# Altium schematic symbol library jlcpcb_2025_04_capacitors_extended_1210.schlib: 709 symbols (part 1 of 4) (continued)
## 1210B222K202CT
designator C?  Capacitance: 2.2nF  (hidden comment: *)
Capacitor, Ceramic (MLCC), 2.2nF, ±10%, 2kV, X7R, ±10%, SMD 1210; Manufacturer: Walsin Tech Corp; Manufacturer Part Number: 1210B222K202CT; Package Size: 1210; JLCPCB Basic Part: No; JLCPCB Part Number: C384714; Supplier 1: LCSC; Category: Capacitors - MLCC; Supplier Part Number 1: C384714; Tolerance: ±10%; Voltage Rating: 2kV; Temperature Coefficient: X7R; RoHS: Yes; ComponentLink1Description: Datasheet; ComponentLink1URL: https://wmsc.lcsc.com/wmsc/upload/file/pdf/v2/lcsc/2304140030_Walsin-Tech-Corp-1210B222K202CT_C384714.pdf; ComponentLink2Description: JLCPCB Part URL; ComponentLink2URL: https://jlcpcb.com/partdetail/C384714; ComponentLink3Description: LCSC Part URL; ComponentLink3URL: https://lcsc.com/product-detail/Multilayer-Ceramic-Capacitors-MLCC---SMD-SMT_Walsin-Tech-Corp-Walsin-Tech-Corp-1210B222K202CT_C384714.html
footprint CAP-1210 (1210 (3225M) Capacitor)
pins: 1, 2

## 1210B222K202NT
designator C?  Capacitance: 2.2nF  (hidden comment: *)
Capacitor, Ceramic (MLCC), 2.2nF, ±10%, 2kV, ±10%, SMD 1210; Manufacturer: FH(Guangdong Fenghua Advanced Tech); Manufacturer Part Number: 1210B222K202NT; Package Size: 1210; JLCPCB Basic Part: No; JLCPCB Part Number: C304014; Supplier 1: LCSC; Category: Capacitors - MLCC; Supplier Part Number 1: C304014; Tolerance: ±10%; Voltage Rating: 2kV; RoHS: Yes; ComponentLink1Description: Datasheet; ComponentLink1URL: https://wmsc.lcsc.com/wmsc/upload/file/pdf/v2/lcsc/2304140030_FH--Guangdong-Fenghua-Advanced-Tech-1210B222K202NT_C304014.pdf; ComponentLink2Description: JLCPCB Part URL; ComponentLink2URL: https://jlcpcb.com/partdetail/C304014; ComponentLink3Description: LCSC Part URL; ComponentLink3URL: https://lcsc.com/product-detail/Multilayer-Ceramic-Capacitors-MLCC---SMD-SMT_FH-Guangdong-Fenghua-Advanced-Tech-FH-Guangdong-Fenghua-Advanced-Tech-1210B222K202NT_C304014.html
footprint CAP-1210 (1210 (3225M) Capacitor)
pins: 1, 2

## 1210B223K102CT
designator C?  Capacitance: 22nF  (hidden comment: *)
Capacitor, Ceramic (MLCC), 22nF, ±10%, 1kV, X7R, ±10%, SMD 1210; Manufacturer: Walsin Tech Corp; Manufacturer Part Number: 1210B223K102CT; Package Size: 1210; JLCPCB Basic Part: No; JLCPCB Part Number: C304015; Supplier 1: LCSC; Category: Capacitors - MLCC; Supplier Part Number 1: C304015; Tolerance: ±10%; Voltage Rating: 1kV; Temperature Coefficient: X7R; RoHS: Yes; ComponentLink1Description: Datasheet; ComponentLink1URL: https://wmsc.lcsc.com/wmsc/upload/file/pdf/v2/lcsc/2304231850_Walsin-Tech-Corp-1210B223K102CT_C304015.pdf; ComponentLink2Description: JLCPCB Part URL; ComponentLink2URL: https://jlcpcb.com/partdetail/C304015; ComponentLink3Description: LCSC Part URL; ComponentLink3URL: https://lcsc.com/product-detail/Multilayer-Ceramic-Capacitors-MLCC---SMD-SMT_Walsin-Tech-Corp-Walsin-Tech-Corp-1210B223K102CT_C304015.html
footprint CAP-1210 (1210 (3225M) Capacitor)
pins: 1, 2

## 1210B223K102NT
designator C?  Capacitance: 22nF  (hidden comment: *)
Capacitor, Ceramic (MLCC), 22nF, ±10%, 1kV, X7R, ±10%, SMD 1210; Manufacturer: FH (Guangdong Fenghua Advanced Tech); Manufacturer Part Number: 1210B223K102NT; Package Size: 1210; JLCPCB Basic Part: No; JLCPCB Part Number: C3037670; Supplier 1: LCSC; Category: Capacitors - MLCC; Supplier Part Number 1: C3037670; Tolerance: ±10%; Voltage Rating: 1kV; Temperature Coefficient: X7R; RoHS: Yes; ComponentLink1Description: Datasheet; ComponentLink1URL: https://wmsc.lcsc.com/wmsc/upload/file/pdf/v2/lcsc/2206171645_FH--Guangdong-Fenghua-Advanced-Tech-1210B223K102NT_C3037670.pdf; ComponentLink2Description: JLCPCB Part URL; ComponentLink2URL: https://jlcpcb.com/partdetail/C3037670; ComponentLink3Description: LCSC Part URL; ComponentLink3URL: https://lcsc.com/product-detail/Multilayer-Ceramic-Capacitors-MLCC---SMD-SMT_FH-Guangdong-Fenghua-Advanced-Tech-FH-Guangdong-Fenghua-Advanced-Tech-1210B223K102NT_C3037670.html
footprint CAP-1210 (1210 (3225M) Capacitor)
pins: 1, 2

## 1210B223K500NT
designator C?  Capacitance: 22nF  (hidden comment: *)
Capacitor, Ceramic (MLCC), 22nF, ±10%, 50V, X7R, ±10%, SMD 1210; Manufacturer: FH (Guangdong Fenghua Advanced Tech); Manufacturer Part Number: 1210B223K500NT; Package Size: 1210; JLCPCB Basic Part: No; JLCPCB Part Number: C3037671; Supplier 1: LCSC; Category: Capacitors - MLCC; Supplier Part Number 1: C3037671; Tolerance: ±10%; Voltage Rating: 50V; Temperature Coefficient: X7R; RoHS: Yes; ComponentLink1Description: Datasheet; ComponentLink1URL: https://wmsc.lcsc.com/wmsc/upload/file/pdf/v2/lcsc/2206171645_FH--Guangdong-Fenghua-Advanced-Tech-1210B223K500NT_C3037671.pdf; ComponentLink2Description: JLCPCB Part URL; ComponentLink2URL: https://jlcpcb.com/partdetail/C3037671; ComponentLink3Description: LCSC Part URL; ComponentLink3URL: https://lcsc.com/product-detail/Multilayer-Ceramic-Capacitors-MLCC---SMD-SMT_FH-Guangdong-Fenghua-Advanced-Tech-FH-Guangdong-Fenghua-Advanced-Tech-1210B223K500NT_C3037671.html
footprint CAP-1210 (1210 (3225M) Capacitor)
pins: 1, 2

## 1210B223K501CT
designator C?  Capacitance: 22nF  (hidden comment: *)
Capacitor, Ceramic (MLCC), 22nF, ±10%, 500V, X7R, ±10%, SMD 1210; Manufacturer: Walsin Tech Corp; Manufacturer Part Number: 1210B223K501CT; Package Size: 1210; JLCPCB Basic Part: No; JLCPCB Part Number: C77533; Supplier 1: LCSC; Category: Capacitors - MLCC; Supplier Part Number 1: C77533; Tolerance: ±10%; Voltage Rating: 500V; Temperature Coefficient: X7R; RoHS: Yes; ComponentLink1Description: Datasheet; ComponentLink1URL: https://wmsc.lcsc.com/wmsc/upload/file/pdf/v2/lcsc/1809301128_Walsin-Tech-Corp-1210B223K501CT_C77533.pdf; ComponentLink2Description: JLCPCB Part URL; ComponentLink2URL: https://jlcpcb.com/partdetail/C77533; ComponentLink3Description: LCSC Part URL; ComponentLink3URL: https://lcsc.com/product-detail/Multilayer-Ceramic-Capacitors-MLCC---SMD-SMT_Walsin-Tech-Corp-Walsin-Tech-Corp-1210B223K501CT_C77533.html
footprint CAP-1210 (1210 (3225M) Capacitor)
pins: 1, 2

## 1210B223K631CT
designator C?  Capacitance: 22nF  (hidden comment: *)
Capacitor, Ceramic (MLCC), 22nF, ±10%, 630V, X7R, ±10%, SMD 1210; Manufacturer: Walsin Tech Corp; Manufacturer Part Number: 1210B223K631CT; Package Size: 1210; JLCPCB Basic Part: No; JLCPCB Part Number: C515685; Supplier 1: LCSC; Category: Capacitors - MLCC; Supplier Part Number 1: C515685; Tolerance: ±10%; Voltage Rating: 630V; Temperature Coefficient: X7R; RoHS: Yes; ComponentLink1Description: Datasheet; ComponentLink1URL: https://wmsc.lcsc.com/wmsc/upload/file/pdf/v2/lcsc/2304140030_Walsin-Tech-Corp-1210B223K631CT_C515685.pdf; ComponentLink2Description: JLCPCB Part URL; ComponentLink2URL: https://jlcpcb.com/partdetail/C515685; ComponentLink3Description: LCSC Part URL; ComponentLink3URL: https://lcsc.com/product-detail/Multilayer-Ceramic-Capacitors-MLCC---SMD-SMT_Walsin-Tech-Corp-Walsin-Tech-Corp-1210B223K631CT_C515685.html
footprint CAP-1210 (1210 (3225M) Capacitor)
pins: 1, 2

## 1210B224K101CT
designator C?  Capacitance: 220nF  (hidden comment: *)
Capacitor, Ceramic (MLCC), 220nF, ±10%, 100V, X7R, ±10%, SMD 1210; Manufacturer: Walsin Tech Corp; Manufacturer Part Number: 1210B224K101CT; Package Size: 1210; JLCPCB Basic Part: No; JLCPCB Part Number: C396814; Supplier 1: LCSC; Category: Capacitors - MLCC; Supplier Part Number 1: C396814; Tolerance: ±10%; Voltage Rating: 100V; Temperature Coefficient: X7R; RoHS: Yes; ComponentLink1Description: Datasheet; ComponentLink1URL: https://wmsc.lcsc.com/wmsc/upload/file/pdf/v2/lcsc/2304140030_Walsin-Tech-Corp-1210B224K101CT_C396814.pdf; ComponentLink2Description: JLCPCB Part URL; ComponentLink2URL: https://jlcpcb.com/partdetail/C396814; ComponentLink3Description: LCSC Part URL; ComponentLink3URL: https://lcsc.com/product-detail/Multilayer-Ceramic-Capacitors-MLCC---SMD-SMT_Walsin-Tech-Corp-Walsin-Tech-Corp-1210B224K101CT_C396814.html
footprint CAP-1210 (1210 (3225M) Capacitor)
pins: 1, 2

## 1210B224K101NT
designator C?  Capacitance: 220nF  (hidden comment: *)
Capacitor, Ceramic (MLCC), 220nF, ±10%, 100V, X7R, ±10%, SMD 1210; Manufacturer: FH(Guangdong Fenghua Advanced Tech); Manufacturer Part Number: 1210B224K101NT; Package Size: 1210; JLCPCB Basic Part: No; JLCPCB Part Number: C72067; Supplier 1: LCSC; Category: Capacitors - MLCC; Supplier Part Number 1: C72067; Tolerance: ±10%; Voltage Rating: 100V; Temperature Coefficient: X7R; RoHS: Yes; ComponentLink1Description: Datasheet; ComponentLink1URL: https://wmsc.lcsc.com/wmsc/upload/file/pdf/v2/lcsc/2304140030_FH--Guangdong-Fenghua-Advanced-Tech-1210B224K101NT_C72067.pdf; ComponentLink2Description: JLCPCB Part URL; ComponentLink2URL: https://jlcpcb.com/partdetail/C72067; ComponentLink3Description: LCSC Part URL; ComponentLink3URL: https://lcsc.com/product-detail/Multilayer-Ceramic-Capacitors-MLCC---SMD-SMT_FH-Guangdong-Fenghua-Advanced-Tech-FH-Guangdong-Fenghua-Advanced-Tech-1210B224K101NT_C72067.html
footprint CAP-1210 (1210 (3225M) Capacitor)
pins: 1, 2

## 1210B224K251NT
designator C?  Capacitance: 220000pF  (hidden comment: *)
Capacitor, Ceramic (MLCC), 220000pF, ±10%, 250V, X7R, ±10%, SMD 1210; Manufacturer: FH (Guangdong Fenghua Advanced Tech); Manufacturer Part Number: 1210B224K251NT; Package Size: 1210; JLCPCB Basic Part: No; JLCPCB Part Number: C967601; Supplier 1: LCSC; Category: Capacitors - MLCC; Supplier Part Number 1: C967601; Tolerance: ±10%; Voltage Rating: 250V; Temperature Coefficient: X7R; RoHS: Yes; ComponentLink1Description: Datasheet; ComponentLink1URL: https://wmsc.lcsc.com/wmsc/upload/file/pdf/v2/lcsc/2304140030_FH--Guangdong-Fenghua-Advanced-Tech-1210B224K251NT_C967601.pdf; ComponentLink2Description: JLCPCB Part URL; ComponentLink2URL: https://jlcpcb.com/partdetail/C967601; ComponentLink3Description: LCSC Part URL; ComponentLink3URL: https://lcsc.com/product-detail/Multilayer-Ceramic-Capacitors-MLCC---SMD-SMT_FH-Guangdong-Fenghua-Advanced-Tech-FH-Guangdong-Fenghua-Advanced-Tech-1210B224K251NT_C967601.html
footprint CAP-1210 (1210 (3225M) Capacitor)
pins: 1, 2

## 1210B224K500NT
designator C?  Capacitance: 220nF  (hidden comment: *)
Capacitor, Ceramic (MLCC), 220nF, ±10%, 50V, ±10%, SMD 1210; Manufacturer: FH(Guangdong Fenghua Advanced Tech); Manufacturer Part Number: 1210B224K500NT; Package Size: 1210; JLCPCB Basic Part: No; JLCPCB Part Number: C1322393; Supplier 1: LCSC; Category: Capacitors - MLCC; Supplier Part Number 1: C1322393; Tolerance: ±10%; Voltage Rating: 50V; RoHS: Yes; ComponentLink1Description: Datasheet; ComponentLink1URL: https://wmsc.lcsc.com/wmsc/upload/file/pdf/v2/lcsc/2304140030_FH--Guangdong-Fenghua-Advanced-Tech-1210B224K500NT_C1322393.pdf; ComponentLink2Description: JLCPCB Part URL; ComponentLink2URL: https://jlcpcb.com/partdetail/C1322393; ComponentLink3Description: LCSC Part URL; ComponentLink3URL: https://lcsc.com/product-detail/Multilayer-Ceramic-Capacitors-MLCC---SMD-SMT_FH-Guangdong-Fenghua-Advanced-Tech-FH-Guangdong-Fenghua-Advanced-Tech-1210B224K500NT_C1322393.html
footprint CAP-1210 (1210 (3225M) Capacitor)
pins: 1, 2

## 1210B225K101CT
designator C?  Capacitance: 2.2uF  (hidden comment: *)
Capacitor, Ceramic (MLCC), 2.2uF, ±10%, 100V, X7R, ±10%, SMD 1210; Manufacturer: Walsin Tech Corp; Manufacturer Part Number: 1210B225K101CT; Package Size: 1210; JLCPCB Basic Part: No; JLCPCB Part Number: C338133; Supplier 1: LCSC; Category: Capacitors - MLCC; Supplier Part Number 1: C338133; Tolerance: ±10%; Voltage Rating: 100V; Temperature Coefficient: X7R; RoHS: Yes; ComponentLink1Description: Datasheet; ComponentLink1URL: https://wmsc.lcsc.com/wmsc/upload/file/pdf/v2/lcsc/2304140030_Walsin-Tech-Corp-1210B225K101CT_C338133.pdf; ComponentLink2Description: JLCPCB Part URL; ComponentLink2URL: https://jlcpcb.com/partdetail/C338133; ComponentLink3Description: LCSC Part URL; ComponentLink3URL: https://lcsc.com/product-detail/Multilayer-Ceramic-Capacitors-MLCC---SMD-SMT_Walsin-Tech-Corp-Walsin-Tech-Corp-1210B225K101CT_C338133.html
footprint CAP-1210 (1210 (3225M) Capacitor)
pins: 1, 2

## 1210B225K101NT
designator C?  Capacitance: 2.2uF  (hidden comment: *)
Capacitor, Ceramic (MLCC), 2.2uF, ±10%, 100V, X7R, ±10%, SMD 1210; Manufacturer: FH(Guangdong Fenghua Advanced Tech); Manufacturer Part Number: 1210B225K101NT; Package Size: 1210; JLCPCB Basic Part: No; JLCPCB Part Number: C962231; Supplier 1: LCSC; Category: Capacitors - MLCC; Supplier Part Number 1: C962231; Tolerance: ±10%; Voltage Rating: 100V; Temperature Coefficient: X7R; RoHS: Yes; ComponentLink1Description: Datasheet; ComponentLink1URL: https://wmsc.lcsc.com/wmsc/upload/file/pdf/v2/lcsc/2304140030_FH--Guangdong-Fenghua-Advanced-Tech-1210B225K101NT_C962231.pdf; ComponentLink2Description: JLCPCB Part URL; ComponentLink2URL: https://jlcpcb.com/partdetail/C962231; ComponentLink3Description: LCSC Part URL; ComponentLink3URL: https://lcsc.com/product-detail/Multilayer-Ceramic-Capacitors-MLCC---SMD-SMT_FH-Guangdong-Fenghua-Advanced-Tech-FH-Guangdong-Fenghua-Advanced-Tech-1210B225K101NT_C962231.html
footprint CAP-1210 (1210 (3225M) Capacitor)
pins: 1, 2

## 1210B225K500CT
designator C?  Capacitance: 2.2uF  (hidden comment: *)
Capacitor, Ceramic (MLCC), 2.2uF, ±10%, 50V, X7R, ±10%, SMD 1210; Manufacturer: Walsin Tech Corp; Manufacturer Part Number: 1210B225K500CT; Package Size: 1210; JLCPCB Basic Part: No; JLCPCB Part Number: C3852432; Supplier 1: LCSC; Category: Capacitors - MLCC; Supplier Part Number 1: C3852432; Tolerance: ±10%; Voltage Rating: 50V; Temperature Coefficient: X7R; RoHS: Yes; ComponentLink1Description: Datasheet; ComponentLink1URL: https://wmsc.lcsc.com/wmsc/upload/file/pdf/v2/lcsc/2401181613_Walsin-Tech-Corp-1210B225K500CT_C3852432.pdf; ComponentLink2Description: JLCPCB Part URL; ComponentLink2URL: https://jlcpcb.com/partdetail/C3852432; ComponentLink3Description: LCSC Part URL; ComponentLink3URL: https://lcsc.com/product-detail/Multilayer-Ceramic-Capacitors-MLCC---SMD-SMT_Walsin-Tech-Corp-Walsin-Tech-Corp-1210B225K500CT_C3852432.html
footprint CAP-1210 (1210 (3225M) Capacitor)
pins: 1, 2

## 1210B225K500NT
designator C?  Capacitance: 2.2uF  (hidden comment: *)
Capacitor, Ceramic (MLCC), 2.2uF, ±10%, 50V, X7R, ±10%, SMD 1210; Manufacturer: FH(Guangdong Fenghua Advanced Tech); Manufacturer Part Number: 1210B225K500NT; Package Size: 1210; JLCPCB Basic Part: No; JLCPCB Part Number: C1950; Supplier 1: LCSC; Category: Capacitors - MLCC; Supplier Part Number 1: C1950; Tolerance: ±10%; Voltage Rating: 50V; Temperature Coefficient: X7R; RoHS: Yes; ComponentLink1Description: Datasheet; ComponentLink1URL: https://wmsc.lcsc.com/wmsc/upload/file/pdf/v2/lcsc/2304140030_FH--Guangdong-Fenghua-Advanced-Tech-1210B225K500NT_C1950.pdf; ComponentLink2Description: JLCPCB Part URL; ComponentLink2URL: https://jlcpcb.com/partdetail/C1950; ComponentLink3Description: LCSC Part URL; ComponentLink3URL: https://lcsc.com/product-detail/Multilayer-Ceramic-Capacitors-MLCC---SMD-SMT_FH-Guangdong-Fenghua-Advanced-Tech-FH-Guangdong-Fenghua-Advanced-Tech-1210B225K500NT_C1950.html
footprint CAP-1210 (1210 (3225M) Capacitor)
pins: 1, 2

## 1210B226K250CT
designator C?  Capacitance: 22uF  (hidden comment: *)
Capacitor, Ceramic (MLCC), 22uF, ±10%, 25V, X7R, ±10%, SMD 1210; Manufacturer: Walsin Tech Corp; Manufacturer Part Number: 1210B226K250CT; Package Size: 1210; JLCPCB Basic Part: No; JLCPCB Part Number: C515687; Supplier 1: LCSC; Category: Capacitors - MLCC; Supplier Part Number 1: C515687; Tolerance: ±10%; Voltage Rating: 25V; Temperature Coefficient: X7R; RoHS: Yes; ComponentLink1Description: Datasheet; ComponentLink1URL: https://wmsc.lcsc.com/wmsc/upload/file/pdf/v2/lcsc/2304140030_Walsin-Tech-Corp-1210B226K250CT_C515687.pdf; ComponentLink2Description: JLCPCB Part URL; ComponentLink2URL: https://jlcpcb.com/partdetail/C515687; ComponentLink3Description: LCSC Part URL; ComponentLink3URL: https://lcsc.com/product-detail/Multilayer-Ceramic-Capacitors-MLCC---SMD-SMT_Walsin-Tech-Corp-Walsin-Tech-Corp-1210B226K250CT_C515687.html
footprint CAP-1210 (1210 (3225M) Capacitor)
pins: 1, 2

## 1210B226K250NT
designator C?  Capacitance: 22uF  (hidden comment: *)
Capacitor, Ceramic (MLCC), 22uF, 25V, SMD 1210; Manufacturer: FH (Guangdong Fenghua Advanced Tech); Manufacturer Part Number: 1210B226K250NT; Package Size: 1210; JLCPCB Basic Part: No; JLCPCB Part Number: C5204920; Supplier 1: LCSC; Category: Capacitors - MLCC; Supplier Part Number 1: C5204920; Voltage Rating: 25V; RoHS: Yes; ComponentLink1Description: Datasheet; ComponentLink2Description: JLCPCB Part URL; ComponentLink2URL: https://jlcpcb.com/partdetail/C5204920; ComponentLink3Description: LCSC Part URL; ComponentLink3URL: https://lcsc.com/product-detail/Multilayer-Ceramic-Capacitors-MLCC---SMD-SMT_FH-Guangdong-Fenghua-Advanced-Tech-FH-Guangdong-Fenghua-Advanced-Tech-1210B226K250NT_C5204920.html
footprint CAP-1210 (1210 (3225M) Capacitor)
pins: 1, 2

## 1210B226M160
designator C?  Capacitance: 22uF  (hidden comment: *)
Capacitor, Ceramic (MLCC), 22uF, ±20%, 16V, X7R, ±20%, SMD 1210; Manufacturer: Walsin Tech Corp; Manufacturer Part Number: 1210B226M160; Package Size: 1210; JLCPCB Basic Part: No; JLCPCB Part Number: C123667; Supplier 1: LCSC; Category: Capacitors - MLCC; Supplier Part Number 1: C123667; Tolerance: ±20%; Voltage Rating: 16V; Temperature Coefficient: X7R; RoHS: Yes; ComponentLink1Description: Datasheet; ComponentLink1URL: https://wmsc.lcsc.com/wmsc/upload/file/pdf/v2/lcsc/2304140030_Walsin-Tech-Corp-1210B226M160_C123667.pdf; ComponentLink2Description: JLCPCB Part URL; ComponentLink2URL: https://jlcpcb.com/partdetail/C123667; ComponentLink3Description: LCSC Part URL; ComponentLink3URL: https://lcsc.com/product-detail/Multilayer-Ceramic-Capacitors-MLCC---SMD-SMT_Walsin-Tech-Corp-Walsin-Tech-Corp-1210B226M160_C123667.html
footprint CAP-1210 (1210 (3225M) Capacitor)
pins: 1, 2

## 1210B272K202CT
designator C?  Capacitance: 2.7nF  (hidden comment: *)
Capacitor, Ceramic (MLCC), 2.7nF, ±10%, 2kV, X7R, ±10%, SMD 1210; Manufacturer: Walsin Tech Corp; Manufacturer Part Number: 1210B272K202CT; Package Size: 1210; JLCPCB Basic Part: No; JLCPCB Part Number: C384712; Supplier 1: LCSC; Category: Capacitors - MLCC; Supplier Part Number 1: C384712; Tolerance: ±10%; Voltage Rating: 2kV; Temperature Coefficient: X7R; RoHS: Yes; ComponentLink1Description: Datasheet; ComponentLink1URL: https://wmsc.lcsc.com/wmsc/upload/file/pdf/v2/lcsc/2304140030_Walsin-Tech-Corp-1210B272K202CT_C384712.pdf; ComponentLink2Description: JLCPCB Part URL; ComponentLink2URL: https://jlcpcb.com/partdetail/C384712; ComponentLink3Description: LCSC Part URL; ComponentLink3URL: https://lcsc.com/product-detail/Multilayer-Ceramic-Capacitors-MLCC---SMD-SMT_Walsin-Tech-Corp-Walsin-Tech-Corp-1210B272K202CT_C384712.html
footprint CAP-1210 (1210 (3225M) Capacitor)
pins: 1, 2

## 1210B332K102CT
designator C?  Capacitance: 3.3nF  (hidden comment: *)
Capacitor, Ceramic (MLCC), 3.3nF, ±10%, 1kV, X7R, ±10%, SMD 1210; Manufacturer: Walsin Tech Corp; Manufacturer Part Number: 1210B332K102CT; Package Size: 1210; JLCPCB Basic Part: No; JLCPCB Part Number: C304016; Supplier 1: LCSC; Category: Capacitors - MLCC; Supplier Part Number 1: C304016; Tolerance: ±10%; Voltage Rating: 1kV; Temperature Coefficient: X7R; RoHS: Yes; ComponentLink1Description: Datasheet; ComponentLink1URL: https://wmsc.lcsc.com/wmsc/upload/file/pdf/v2/lcsc/2304231850_Walsin-Tech-Corp-1210B332K102CT_C304016.pdf; ComponentLink2Description: JLCPCB Part URL; ComponentLink2URL: https://jlcpcb.com/partdetail/C304016; ComponentLink3Description: LCSC Part URL; ComponentLink3URL: https://lcsc.com/product-detail/Multilayer-Ceramic-Capacitors-MLCC---SMD-SMT_Walsin-Tech-Corp-Walsin-Tech-Corp-1210B332K102CT_C304016.html
footprint CAP-1210 (1210 (3225M) Capacitor)
pins: 1, 2

## 1210B332K202CT
designator C?  Capacitance: 3.3nF  (hidden comment: *)
Capacitor, Ceramic (MLCC), 3.3nF, ±10%, 2kV, X7R, ±10%, SMD 1210; Manufacturer: Walsin Tech Corp; Manufacturer Part Number: 1210B332K202CT; Package Size: 1210; JLCPCB Basic Part: No; JLCPCB Part Number: C2918605; Supplier 1: LCSC; Category: Capacitors - MLCC; Supplier Part Number 1: C2918605; Tolerance: ±10%; Voltage Rating: 2kV; Temperature Coefficient: X7R; RoHS: Yes; ComponentLink1Description: Datasheet; ComponentLink1URL: https://wmsc.lcsc.com/wmsc/upload/file/pdf/v2/lcsc/2111171830_Walsin-Tech-Corp-1210B332K202CT_C2918605.pdf; ComponentLink2Description: JLCPCB Part URL; ComponentLink2URL: https://jlcpcb.com/partdetail/C2918605; ComponentLink3Description: LCSC Part URL; ComponentLink3URL: https://lcsc.com/product-detail/Multilayer-Ceramic-Capacitors-MLCC---SMD-SMT_Walsin-Tech-Corp-Walsin-Tech-Corp-1210B332K202CT_C2918605.html
footprint CAP-1210 (1210 (3225M) Capacitor)
pins: 1, 2

## 1210B333K102CT
designator C?  Capacitance: 33nF  (hidden comment: *)
Capacitor, Ceramic (MLCC), 33nF, ±10%, 1kV, X7R, ±10%, SMD 1210; Manufacturer: Walsin Tech Corp; Manufacturer Part Number: 1210B333K102CT; Package Size: 1210; JLCPCB Basic Part: No; JLCPCB Part Number: C304017; Supplier 1: LCSC; Category: Capacitors - MLCC; Supplier Part Number 1: C304017; Tolerance: ±10%; Voltage Rating: 1kV; Temperature Coefficient: X7R; RoHS: Yes; ComponentLink1Description: Datasheet; ComponentLink1URL: https://wmsc.lcsc.com/wmsc/upload/file/pdf/v2/lcsc/2304231850_Walsin-Tech-Corp-1210B333K102CT_C304017.pdf; ComponentLink2Description: JLCPCB Part URL; ComponentLink2URL: https://jlcpcb.com/partdetail/C304017; ComponentLink3Description: LCSC Part URL; ComponentLink3URL: https://lcsc.com/product-detail/Multilayer-Ceramic-Capacitors-MLCC---SMD-SMT_Walsin-Tech-Corp-Walsin-Tech-Corp-1210B333K102CT_C304017.html
footprint CAP-1210 (1210 (3225M) Capacitor)
pins: 1, 2

## 1210B333K251NT
designator C?  Capacitance: 33nF  (hidden comment: *)
Capacitor, Ceramic (MLCC), 33nF, ±10%, 250V, ±10%, SMD 1210; Manufacturer: FH(Guangdong Fenghua Advanced Tech); Manufacturer Part Number: 1210B333K251NT; Package Size: 1210; JLCPCB Basic Part: No; JLCPCB Part Number: C1322394; Supplier 1: LCSC; Category: Capacitors - MLCC; Supplier Part Number 1: C1322394; Tolerance: ±10%; Voltage Rating: 250V; RoHS: Yes; ComponentLink1Description: Datasheet; ComponentLink1URL: https://wmsc.lcsc.com/wmsc/upload/file/pdf/v2/lcsc/2304140030_FH--Guangdong-Fenghua-Advanced-Tech-1210B333K251NT_C1322394.pdf; ComponentLink2Description: JLCPCB Part URL; ComponentLink2URL: https://jlcpcb.com/partdetail/C1322394; ComponentLink3Description: LCSC Part URL; ComponentLink3URL: https://lcsc.com/product-detail/Multilayer-Ceramic-Capacitors-MLCC---SMD-SMT_FH-Guangdong-Fenghua-Advanced-Tech-FH-Guangdong-Fenghua-Advanced-Tech-1210B333K251NT_C1322394.html
footprint CAP-1210 (1210 (3225M) Capacitor)
pins: 1, 2

## 1210B333K631CT
designator C?  Capacitance: 33nF  (hidden comment: *)
Capacitor, Ceramic (MLCC), 33nF, ±10%, 630V, X7R, ±10%, SMD 1210; Manufacturer: Walsin Tech Corp; Manufacturer Part Number: 1210B333K631CT; Package Size: 1210; JLCPCB Basic Part: No; JLCPCB Part Number: C304018; Supplier 1: LCSC; Category: Capacitors - MLCC; Supplier Part Number 1: C304018; Tolerance: ±10%; Voltage Rating: 630V; Temperature Coefficient: X7R; RoHS: Yes; ComponentLink1Description: Datasheet; ComponentLink1URL: https://wmsc.lcsc.com/wmsc/upload/file/pdf/v2/lcsc/2304231850_Walsin-Tech-Corp-1210B333K631CT_C304018.pdf; ComponentLink2Description: JLCPCB Part URL; ComponentLink2URL: https://jlcpcb.com/partdetail/C304018; ComponentLink3Description: LCSC Part URL; ComponentLink3URL: https://lcsc.com/product-detail/Multilayer-Ceramic-Capacitors-MLCC---SMD-SMT_Walsin-Tech-Corp-Walsin-Tech-Corp-1210B333K631CT_C304018.html
footprint CAP-1210 (1210 (3225M) Capacitor)
pins: 1, 2

## 1210B334K101NT
designator C?  Capacitance: 330nF  (hidden comment: *)
Capacitor, Ceramic (MLCC), 330nF, ±10%, 100V, X7R, ±10%, SMD 1210; Manufacturer: FH (Guangdong Fenghua Advanced Tech); Manufacturer Part Number: 1210B334K101NT; Package Size: 1210; JLCPCB Basic Part: No; JLCPCB Part Number: C3037672; Supplier 1: LCSC; Category: Capacitors - MLCC; Supplier Part Number 1: C3037672; Tolerance: ±10%; Voltage Rating: 100V; Temperature Coefficient: X7R; RoHS: Yes; ComponentLink1Description: Datasheet; ComponentLink1URL: https://wmsc.lcsc.com/wmsc/upload/file/pdf/v2/lcsc/2206171645_FH--Guangdong-Fenghua-Advanced-Tech-1210B334K101NT_C3037672.pdf; ComponentLink2Description: JLCPCB Part URL; ComponentLink2URL: https://jlcpcb.com/partdetail/C3037672; ComponentLink3Description: LCSC Part URL; ComponentLink3URL: https://lcsc.com/product-detail/Multilayer-Ceramic-Capacitors-MLCC---SMD-SMT_FH-Guangdong-Fenghua-Advanced-Tech-FH-Guangdong-Fenghua-Advanced-Tech-1210B334K101NT_C3037672.html
footprint CAP-1210 (1210 (3225M) Capacitor)
pins: 1, 2

## 1210B472K102NT
designator C?  Capacitance: 4.7nF  (hidden comment: *)
Capacitor, Ceramic (MLCC), 4.7nF, ±10%, 1kV, ±10%, SMD 1210; Manufacturer: FH-BK(Guangdong Fenghua Bangke Elec); Manufacturer Part Number: 1210B472K102NT; Package Size: 1210; JLCPCB Basic Part: No; JLCPCB Part Number: C2830701; Supplier 1: LCSC; Category: Capacitors - MLCC; Supplier Part Number 1: C2830701; Tolerance: ±10%; Voltage Rating: 1kV; RoHS: Yes; ComponentLink1Description: Datasheet; ComponentLink1URL: https://wmsc.lcsc.com/wmsc/upload/file/pdf/v2/lcsc/2105241635_FH-BK-Guangdong-Fenghua-Bangke-Elec-1210B472K102NT_C2830701.pdf; ComponentLink2Description: JLCPCB Part URL; ComponentLink2URL: https://jlcpcb.com/partdetail/C2830701; ComponentLink3Description: LCSC Part URL; ComponentLink3URL: https://lcsc.com/product-detail/Multilayer-Ceramic-Capacitors-MLCC---SMD-SMT_FH-BKGuangdong-Fenghua-Bangke-Elec-FH-BKGuangdong-Fenghua-Bangke-Elec-1210B472K102NT_C2830701.html
footprint CAP-1210 (1210 (3225M) Capacitor)
pins: 1, 2

## 1210B472K202NT
designator C?  Capacitance: 4.7nF  (hidden comment: *)
Capacitor, Ceramic (MLCC), 4.7nF, ±10%, 2kV, X7R, ±10%, SMD 1210; Manufacturer: FH(Guangdong Fenghua Advanced Tech); Manufacturer Part Number: 1210B472K202NT; Package Size: 1210; JLCPCB Basic Part: No; JLCPCB Part Number: C32592; Supplier 1: LCSC; Category: Capacitors - MLCC; Supplier Part Number 1: C32592; Tolerance: ±10%; Voltage Rating: 2kV; Temperature Coefficient: X7R; RoHS: Yes; ComponentLink1Description: Datasheet; ComponentLink1URL: https://wmsc.lcsc.com/wmsc/upload/file/pdf/v2/lcsc/2304140030_FH--Guangdong-Fenghua-Advanced-Tech-1210B472K202NT_C32592.pdf; ComponentLink2Description: JLCPCB Part URL; ComponentLink2URL: https://jlcpcb.com/partdetail/C32592; ComponentLink3Description: LCSC Part URL; ComponentLink3URL: https://lcsc.com/product-detail/Multilayer-Ceramic-Capacitors-MLCC---SMD-SMT_FH-Guangdong-Fenghua-Advanced-Tech-FH-Guangdong-Fenghua-Advanced-Tech-1210B472K202NT_C32592.html
footprint CAP-1210 (1210 (3225M) Capacitor)
pins: 1, 2

## 1210B472K251NT
designator C?  Capacitance: 4.7nF  (hidden comment: *)
Capacitor, Ceramic (MLCC), 4.7nF, ±10%, 250V, X7R, ±10%, SMD 1210; Manufacturer: FH(Guangdong Fenghua Advanced Tech); Manufacturer Part Number: 1210B472K251NT; Package Size: 1210; JLCPCB Basic Part: No; JLCPCB Part Number: C52019; Supplier 1: LCSC; Category: Capacitors - MLCC; Supplier Part Number 1: C52019; Tolerance: ±10%; Voltage Rating: 250V; Temperature Coefficient: X7R; RoHS: Yes; ComponentLink1Description: Datasheet; ComponentLink1URL: https://wmsc.lcsc.com/wmsc/upload/file/pdf/v2/lcsc/2304140030_FH--Guangdong-Fenghua-Advanced-Tech-1210B472K251NT_C52019.pdf; ComponentLink2Description: JLCPCB Part URL; ComponentLink2URL: https://jlcpcb.com/partdetail/C52019; ComponentLink3Description: LCSC Part URL; ComponentLink3URL: https://lcsc.com/product-detail/Multilayer-Ceramic-Capacitors-MLCC---SMD-SMT_FH-Guangdong-Fenghua-Advanced-Tech-FH-Guangdong-Fenghua-Advanced-Tech-1210B472K251NT_C52019.html
footprint CAP-1210 (1210 (3225M) Capacitor)
pins: 1, 2

## 1210B472K501CT
designator C?  Capacitance: 4.7nF  (hidden comment: *)
Capacitor, Ceramic (MLCC), 4.7nF, ±10%, 500V, X7R, ±10%, SMD 1210; Manufacturer: Walsin Tech Corp; Manufacturer Part Number: 1210B472K501CT; Package Size: 1210; JLCPCB Basic Part: No; JLCPCB Part Number: C515688; Supplier 1: LCSC; Category: Capacitors - MLCC; Supplier Part Number 1: C515688; Tolerance: ±10%; Voltage Rating: 500V; Temperature Coefficient: X7R; RoHS: Yes; ComponentLink1Description: Datasheet; ComponentLink1URL: https://wmsc.lcsc.com/wmsc/upload/file/pdf/v2/lcsc/2304140030_Walsin-Tech-Corp-1210B472K501CT_C515688.pdf; ComponentLink2Description: JLCPCB Part URL; ComponentLink2URL: https://jlcpcb.com/partdetail/C515688; ComponentLink3Description: LCSC Part URL; ComponentLink3URL: https://lcsc.com/product-detail/Multilayer-Ceramic-Capacitors-MLCC---SMD-SMT_Walsin-Tech-Corp-Walsin-Tech-Corp-1210B472K501CT_C515688.html
footprint CAP-1210 (1210 (3225M) Capacitor)
pins: 1, 2

## 1210B473K101NT
designator C?  Capacitance: 47nF  (hidden comment: *)
Capacitor, Ceramic (MLCC), 47nF, ±10%, 100V, X7R, ±10%, SMD 1210; Manufacturer: FH(Guangdong Fenghua Advanced Tech); Manufacturer Part Number: 1210B473K101NT; Package Size: 1210; JLCPCB Basic Part: No; JLCPCB Part Number: C507414; Supplier 1: LCSC; Category: Capacitors - MLCC; Supplier Part Number 1: C507414; Tolerance: ±10%; Voltage Rating: 100V; Temperature Coefficient: X7R; RoHS: Yes; ComponentLink1Description: Datasheet; ComponentLink1URL: https://wmsc.lcsc.com/wmsc/upload/file/pdf/v2/lcsc/2304140030_FH--Guangdong-Fenghua-Advanced-Tech-1210B473K101NT_C507414.pdf; ComponentLink2Description: JLCPCB Part URL; ComponentLink2URL: https://jlcpcb.com/partdetail/C507414; ComponentLink3Description: LCSC Part URL; ComponentLink3URL: https://lcsc.com/product-detail/Multilayer-Ceramic-Capacitors-MLCC---SMD-SMT_FH-Guangdong-Fenghua-Advanced-Tech-FH-Guangdong-Fenghua-Advanced-Tech-1210B473K101NT_C507414.html
footprint CAP-1210 (1210 (3225M) Capacitor)
pins: 1, 2

## 1210B473K251NT
designator C?  Capacitance: 47nF  (hidden comment: *)
Capacitor, Ceramic (MLCC), 47nF, ±10%, 250V, X7R, ±10%, SMD 1210; Manufacturer: FH (Guangdong Fenghua Advanced Tech); Manufacturer Part Number: 1210B473K251NT; Package Size: 1210; JLCPCB Basic Part: No; JLCPCB Part Number: C3037673; Supplier 1: LCSC; Category: Capacitors - MLCC; Supplier Part Number 1: C3037673; Tolerance: ±10%; Voltage Rating: 250V; Temperature Coefficient: X7R; RoHS: Yes; ComponentLink1Description: Datasheet; ComponentLink1URL: https://wmsc.lcsc.com/wmsc/upload/file/pdf/v2/lcsc/2206171645_FH--Guangdong-Fenghua-Advanced-Tech-1210B473K251NT_C3037673.pdf; ComponentLink2Description: JLCPCB Part URL; ComponentLink2URL: https://jlcpcb.com/partdetail/C3037673; ComponentLink3Description: LCSC Part URL; ComponentLink3URL: https://lcsc.com/product-detail/Multilayer-Ceramic-Capacitors-MLCC---SMD-SMT_FH-Guangdong-Fenghua-Advanced-Tech-FH-Guangdong-Fenghua-Advanced-Tech-1210B473K251NT_C3037673.html
footprint CAP-1210 (1210 (3225M) Capacitor)
pins: 1, 2

## 1210B473K501CT
designator C?  Capacitance: 47nF  (hidden comment: *)
Capacitor, Ceramic (MLCC), 47nF, ±10%, 500V, X7R, ±10%, SMD 1210; Manufacturer: Walsin Tech Corp; Manufacturer Part Number: 1210B473K501CT; Package Size: 1210; JLCPCB Basic Part: No; JLCPCB Part Number: C304019; Supplier 1: LCSC; Category: Capacitors - MLCC; Supplier Part Number 1: C304019; Tolerance: ±10%; Voltage Rating: 500V; Temperature Coefficient: X7R; RoHS: Yes; ComponentLink1Description: Datasheet; ComponentLink1URL: https://wmsc.lcsc.com/wmsc/upload/file/pdf/v2/lcsc/2304231850_Walsin-Tech-Corp-1210B473K501CT_C304019.pdf; ComponentLink2Description: JLCPCB Part URL; ComponentLink2URL: https://jlcpcb.com/partdetail/C304019; ComponentLink3Description: LCSC Part URL; ComponentLink3URL: https://lcsc.com/product-detail/Multilayer-Ceramic-Capacitors-MLCC---SMD-SMT_Walsin-Tech-Corp-Walsin-Tech-Corp-1210B473K501CT_C304019.html
footprint CAP-1210 (1210 (3225M) Capacitor)
pins: 1, 2

## 1210B473K631NT
designator C?  Capacitance: 47000pF  (hidden comment: *)
Capacitor, Ceramic (MLCC), 47000pF, ±10%, 630V, X7R, ±10%, SMD 1210; Manufacturer: FH (Guangdong Fenghua Advanced Tech); Manufacturer Part Number: 1210B473K631NT; Package Size: 1210; JLCPCB Basic Part: No; JLCPCB Part Number: C880379; Supplier 1: LCSC; Category: Capacitors - MLCC; Supplier Part Number 1: C880379; Tolerance: ±10%; Voltage Rating: 630V; Temperature Coefficient: X7R; RoHS: Yes; ComponentLink1Description: Datasheet; ComponentLink1URL: https://wmsc.lcsc.com/wmsc/upload/file/pdf/v2/lcsc/2304140030_FH--Guangdong-Fenghua-Advanced-Tech-1210B473K631NT_C880379.pdf; ComponentLink2Description: JLCPCB Part URL; ComponentLink2URL: https://jlcpcb.com/partdetail/C880379; ComponentLink3Description: LCSC Part URL; ComponentLink3URL: https://lcsc.com/product-detail/Multilayer-Ceramic-Capacitors-MLCC---SMD-SMT_FH-Guangdong-Fenghua-Advanced-Tech-FH-Guangdong-Fenghua-Advanced-Tech-1210B473K631NT_C880379.html
footprint CAP-1210 (1210 (3225M) Capacitor)
pins: 1, 2

## 1210B474K101CT
designator C?  Capacitance: 470nF  (hidden comment: *)
Capacitor, Ceramic (MLCC), 470nF, ±10%, 100V, X7R, ±10%, SMD 1210; Manufacturer: Walsin Tech Corp; Manufacturer Part Number: 1210B474K101CT; Package Size: 1210; JLCPCB Basic Part: No; JLCPCB Part Number: C3855452; Supplier 1: LCSC; Category: Capacitors - MLCC; Supplier Part Number 1: C3855452; Tolerance: ±10%; Voltage Rating: 100V; Temperature Coefficient: X7R; RoHS: Yes; ComponentLink1Description: Datasheet; ComponentLink1URL: https://wmsc.lcsc.com/wmsc/upload/file/pdf/v2/lcsc/2401181624_Walsin-Tech-Corp-1210B474K101CT_C3855452.pdf; ComponentLink2Description: JLCPCB Part URL; ComponentLink2URL: https://jlcpcb.com/partdetail/C3855452; ComponentLink3Description: LCSC Part URL; ComponentLink3URL: https://lcsc.com/product-detail/Multilayer-Ceramic-Capacitors-MLCC---SMD-SMT_Walsin-Tech-Corp-Walsin-Tech-Corp-1210B474K101CT_C3855452.html
footprint CAP-1210 (1210 (3225M) Capacitor)
pins: 1, 2

## 1210B474K101NT
designator C?  Capacitance: 470nF  (hidden comment: *)
Capacitor, Ceramic (MLCC), 470nF, ±10%, 100V, X7R, ±10%, SMD 1210; Manufacturer: FH(Guangdong Fenghua Advanced Tech); Manufacturer Part Number: 1210B474K101NT; Package Size: 1210; JLCPCB Basic Part: No; JLCPCB Part Number: C62438; Supplier 1: LCSC; Category: Capacitors - MLCC; Supplier Part Number 1: C62438; Tolerance: ±10%; Voltage Rating: 100V; Temperature Coefficient: X7R; RoHS: Yes; ComponentLink1Description: Datasheet; ComponentLink1URL: https://wmsc.lcsc.com/wmsc/upload/file/pdf/v2/lcsc/2304140030_FH--Guangdong-Fenghua-Advanced-Tech-1210B474K101NT_C62438.pdf; ComponentLink2Description: JLCPCB Part URL; ComponentLink2URL: https://jlcpcb.com/partdetail/C62438; ComponentLink3Description: LCSC Part URL; ComponentLink3URL: https://lcsc.com/product-detail/Multilayer-Ceramic-Capacitors-MLCC---SMD-SMT_FH-Guangdong-Fenghua-Advanced-Tech-FH-Guangdong-Fenghua-Advanced-Tech-1210B474K101NT_C62438.html
footprint CAP-1210 (1210 (3225M) Capacitor)
pins: 1, 2

## 1210B474K250NT
designator C?  Capacitance: 470nF  (hidden comment: *)
Capacitor, Ceramic (MLCC), 470nF, ±10%, 25V, X7R, ±10%, SMD 1210; Manufacturer: FH (Guangdong Fenghua Advanced Tech); Manufacturer Part Number: 1210B474K250NT; Package Size: 1210; JLCPCB Basic Part: No; JLCPCB Part Number: C3037674; Supplier 1: LCSC; Category: Capacitors - MLCC; Supplier Part Number 1: C3037674; Tolerance: ±10%; Voltage Rating: 25V; Temperature Coefficient: X7R; RoHS: Yes; ComponentLink1Description: Datasheet; ComponentLink1URL: https://wmsc.lcsc.com/wmsc/upload/file/pdf/v2/lcsc/2206171645_FH--Guangdong-Fenghua-Advanced-Tech-1210B474K250NT_C3037674.pdf; ComponentLink2Description: JLCPCB Part URL; ComponentLink2URL: https://jlcpcb.com/partdetail/C3037674; ComponentLink3Description: LCSC Part URL; ComponentLink3URL: https://lcsc.com/product-detail/Multilayer-Ceramic-Capacitors-MLCC---SMD-SMT_FH-Guangdong-Fenghua-Advanced-Tech-FH-Guangdong-Fenghua-Advanced-Tech-1210B474K250NT_C3037674.html
footprint CAP-1210 (1210 (3225M) Capacitor)
pins: 1, 2

## 1210B474K251CT
designator C?  Capacitance: 470nF  (hidden comment: *)
Capacitor, Ceramic (MLCC), 470nF, ±10%, 250V, X7R, ±10%, SMD 1210; Manufacturer: Walsin Tech Corp; Manufacturer Part Number: 1210B474K251CT; Package Size: 1210; JLCPCB Basic Part: No; JLCPCB Part Number: C77534; Supplier 1: LCSC; Category: Capacitors - MLCC; Supplier Part Number 1: C77534; Tolerance: ±10%; Voltage Rating: 250V; Temperature Coefficient: X7R; RoHS: Yes; ComponentLink1Description: Datasheet; ComponentLink1URL: https://wmsc.lcsc.com/wmsc/upload/file/pdf/v2/lcsc/2304140030_Walsin-Tech-Corp-1210B474K251CT_C77534.pdf; ComponentLink2Description: JLCPCB Part URL; ComponentLink2URL: https://jlcpcb.com/partdetail/C77534; ComponentLink3Description: LCSC Part URL; ComponentLink3URL: https://lcsc.com/product-detail/Multilayer-Ceramic-Capacitors-MLCC---SMD-SMT_Walsin-Tech-Corp-Walsin-Tech-Corp-1210B474K251CT_C77534.html
footprint CAP-1210 (1210 (3225M) Capacitor)
pins: 1, 2

## 1210B475K101NT
designator C?  Capacitance: 4.7uF  (hidden comment: *)
Capacitor, Ceramic (MLCC), 4.7uF, ±10%, 100V, ±10%, SMD 1210; Manufacturer: FH(Guangdong Fenghua Advanced Tech); Manufacturer Part Number: 1210B475K101NT; Package Size: 1210; JLCPCB Basic Part: No; JLCPCB Part Number: C2840282; Supplier 1: LCSC; Category: Capacitors - MLCC; Supplier Part Number 1: C2840282; Tolerance: ±10%; Voltage Rating: 100V; RoHS: Yes; ComponentLink1Description: Datasheet; ComponentLink1URL: https://wmsc.lcsc.com/wmsc/upload/file/pdf/v2/lcsc/2202132000_FH--Guangdong-Fenghua-Advanced-Tech-1210B475K101NT_C2840282.pdf; ComponentLink2Description: JLCPCB Part URL; ComponentLink2URL: https://jlcpcb.com/partdetail/C2840282; ComponentLink3Description: LCSC Part URL; ComponentLink3URL: https://lcsc.com/product-detail/Multilayer-Ceramic-Capacitors-MLCC---SMD-SMT_FH-Guangdong-Fenghua-Advanced-Tech-FH-Guangdong-Fenghua-Advanced-Tech-1210B475K101NT_C2840282.html
footprint CAP-1210 (1210 (3225M) Capacitor)
pins: 1, 2

## 1210B475K160CT
designator C?  Capacitance: 4.7uF  (hidden comment: *)
Capacitor, Ceramic (MLCC), 4.7uF, ±10%, 16V, X7R, ±10%, SMD 1210; Manufacturer: Walsin Tech Corp; Manufacturer Part Number: 1210B475K160CT; Package Size: 1210; JLCPCB Basic Part: No; JLCPCB Part Number: C304020; Supplier 1: LCSC; Category: Capacitors - MLCC; Supplier Part Number 1: C304020; Tolerance: ±10%; Voltage Rating: 16V; Temperature Coefficient: X7R; RoHS: Yes; ComponentLink1Description: Datasheet; ComponentLink1URL: https://wmsc.lcsc.com/wmsc/upload/file/pdf/v2/lcsc/2304140030_Walsin-Tech-Corp-1210B475K160CT_C304020.pdf; ComponentLink2Description: JLCPCB Part URL; ComponentLink2URL: https://jlcpcb.com/partdetail/C304020; ComponentLink3Description: LCSC Part URL; ComponentLink3URL: https://lcsc.com/product-detail/Multilayer-Ceramic-Capacitors-MLCC---SMD-SMT_Walsin-Tech-Corp-Walsin-Tech-Corp-1210B475K160CT_C304020.html
footprint CAP-1210 (1210 (3225M) Capacitor)
pins: 1, 2

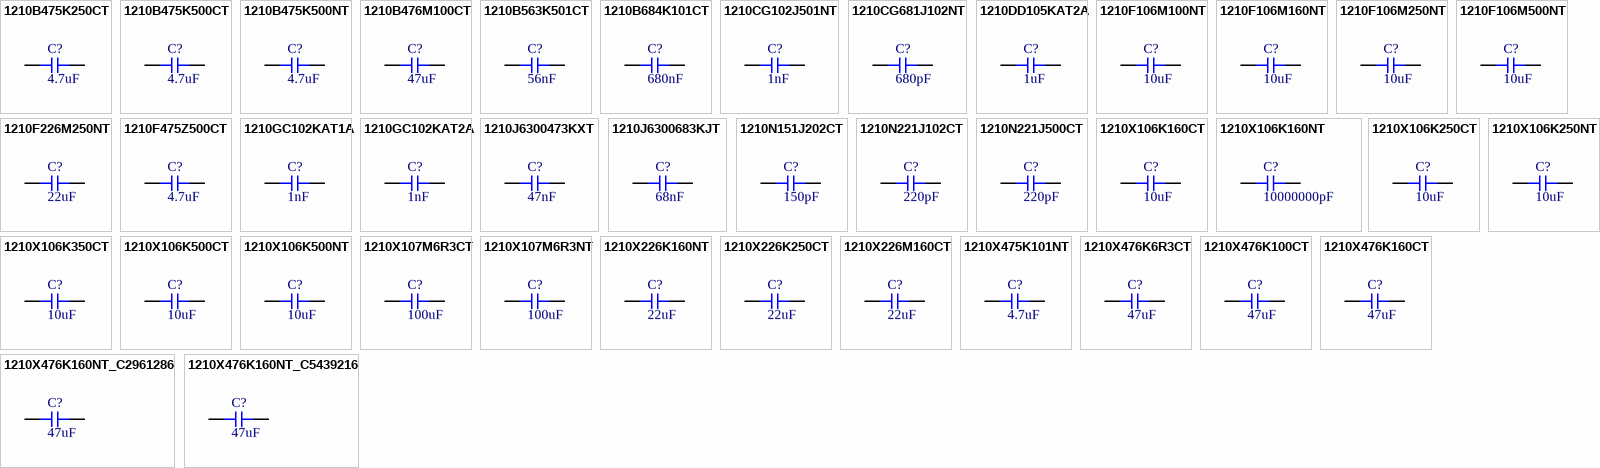
[diagram p2: symbols 1210B475K250CT to 1210X476K160NT_C5439216]

## 1210B475K250CT
designator C?  Capacitance: 4.7uF  (hidden comment: *)
Capacitor, Ceramic (MLCC), 4.7uF, ±10%, 25V, X7R, ±10%, SMD 1210; Manufacturer: Walsin Tech Corp; Manufacturer Part Number: 1210B475K250CT; Package Size: 1210; JLCPCB Basic Part: No; JLCPCB Part Number: C384711; Supplier 1: LCSC; Category: Capacitors - MLCC; Supplier Part Number 1: C384711; Tolerance: ±10%; Voltage Rating: 25V; Temperature Coefficient: X7R; RoHS: Yes; ComponentLink1Description: Datasheet; ComponentLink1URL: https://wmsc.lcsc.com/wmsc/upload/file/pdf/v2/lcsc/2304140030_Walsin-Tech-Corp-1210B475K250CT_C384711.pdf; ComponentLink2Description: JLCPCB Part URL; ComponentLink2URL: https://jlcpcb.com/partdetail/C384711; ComponentLink3Description: LCSC Part URL; ComponentLink3URL: https://lcsc.com/product-detail/Multilayer-Ceramic-Capacitors-MLCC---SMD-SMT_Walsin-Tech-Corp-Walsin-Tech-Corp-1210B475K250CT_C384711.html
footprint CAP-1210 (1210 (3225M) Capacitor)
pins: 1, 2

## 1210B475K500CT
designator C?  Capacitance: 4.7uF  (hidden comment: *)
Capacitor, Ceramic (MLCC), 4.7uF, ±10%, 50V, X7R, ±10%, SMD 1210; Manufacturer: Walsin Tech Corp; Manufacturer Part Number: 1210B475K500CT; Package Size: 1210; JLCPCB Basic Part: No; JLCPCB Part Number: C880822; Supplier 1: LCSC; Category: Capacitors - MLCC; Supplier Part Number 1: C880822; Tolerance: ±10%; Voltage Rating: 50V; Temperature Coefficient: X7R; RoHS: Yes; ComponentLink1Description: Datasheet; ComponentLink1URL: https://wmsc.lcsc.com/wmsc/upload/file/pdf/v2/lcsc/2304140030_Walsin-Tech-Corp-1210B475K500CT_C880822.pdf; ComponentLink2Description: JLCPCB Part URL; ComponentLink2URL: https://jlcpcb.com/partdetail/C880822; ComponentLink3Description: LCSC Part URL; ComponentLink3URL: https://lcsc.com/product-detail/Multilayer-Ceramic-Capacitors-MLCC---SMD-SMT_Walsin-Tech-Corp-Walsin-Tech-Corp-1210B475K500CT_C880822.html
footprint CAP-1210 (1210 (3225M) Capacitor)
pins: 1, 2

## 1210B475K500NT
designator C?  Capacitance: 4.7uF  (hidden comment: *)
Capacitor, Ceramic (MLCC), 4.7uF, ±10%, 50V, X7R, ±10%, SMD 1210; Manufacturer: FH(Guangdong Fenghua Advanced Tech); Manufacturer Part Number: 1210B475K500NT; Package Size: 1210; JLCPCB Basic Part: No; JLCPCB Part Number: C105470; Supplier 1: LCSC; Category: Capacitors - MLCC; Supplier Part Number 1: C105470; Tolerance: ±10%; Voltage Rating: 50V; Temperature Coefficient: X7R; RoHS: Yes; ComponentLink1Description: Datasheet; ComponentLink1URL: https://wmsc.lcsc.com/wmsc/upload/file/pdf/v2/lcsc/2304140030_FH--Guangdong-Fenghua-Advanced-Tech-1210B475K500NT_C105470.pdf; ComponentLink2Description: JLCPCB Part URL; ComponentLink2URL: https://jlcpcb.com/partdetail/C105470; ComponentLink3Description: LCSC Part URL; ComponentLink3URL: https://lcsc.com/product-detail/Multilayer-Ceramic-Capacitors-MLCC---SMD-SMT_FH-Guangdong-Fenghua-Advanced-Tech-FH-Guangdong-Fenghua-Advanced-Tech-1210B475K500NT_C105470.html
footprint CAP-1210 (1210 (3225M) Capacitor)
pins: 1, 2

## 1210B476M100CT
designator C?  Capacitance: 47uF  (hidden comment: *)
Capacitor, Ceramic (MLCC), 47uF, ±20%, 10V, X7R, ±20%, SMD 1210; Manufacturer: Walsin Tech Corp; Manufacturer Part Number: 1210B476M100CT; Package Size: 1210; JLCPCB Basic Part: No; JLCPCB Part Number: C515692; Supplier 1: LCSC; Category: Capacitors - MLCC; Supplier Part Number 1: C515692; Tolerance: ±20%; Voltage Rating: 10V; Temperature Coefficient: X7R; RoHS: Yes; ComponentLink1Description: Datasheet; ComponentLink1URL: https://wmsc.lcsc.com/wmsc/upload/file/pdf/v2/lcsc/2304140030_Walsin-Tech-Corp-1210B476M100CT_C515692.pdf; ComponentLink2Description: JLCPCB Part URL; ComponentLink2URL: https://jlcpcb.com/partdetail/C515692; ComponentLink3Description: LCSC Part URL; ComponentLink3URL: https://lcsc.com/product-detail/Multilayer-Ceramic-Capacitors-MLCC---SMD-SMT_Walsin-Tech-Corp-Walsin-Tech-Corp-1210B476M100CT_C515692.html
footprint CAP-1210 (1210 (3225M) Capacitor)
pins: 1, 2

## 1210B563K501CT
designator C?  Capacitance: 56nF  (hidden comment: *)
Capacitor, Ceramic (MLCC), 56nF, ±10%, 500V, X7R, ±10%, SMD 1210; Manufacturer: Walsin Tech Corp; Manufacturer Part Number: 1210B563K501CT; Package Size: 1210; JLCPCB Basic Part: No; JLCPCB Part Number: C304021; Supplier 1: LCSC; Category: Capacitors - MLCC; Supplier Part Number 1: C304021; Tolerance: ±10%; Voltage Rating: 500V; Temperature Coefficient: X7R; RoHS: Yes; ComponentLink1Description: Datasheet; ComponentLink1URL: https://wmsc.lcsc.com/wmsc/upload/file/pdf/v2/lcsc/2304231850_Walsin-Tech-Corp-1210B563K501CT_C304021.pdf; ComponentLink2Description: JLCPCB Part URL; ComponentLink2URL: https://jlcpcb.com/partdetail/C304021; ComponentLink3Description: LCSC Part URL; ComponentLink3URL: https://lcsc.com/product-detail/Multilayer-Ceramic-Capacitors-MLCC---SMD-SMT_Walsin-Tech-Corp-Walsin-Tech-Corp-1210B563K501CT_C304021.html
footprint CAP-1210 (1210 (3225M) Capacitor)
pins: 1, 2
